# Altium integrated library HRR-Hardware.IntLib: 36 symbols
Pins are listed as number, name and electrical type; pins without a type are passive.

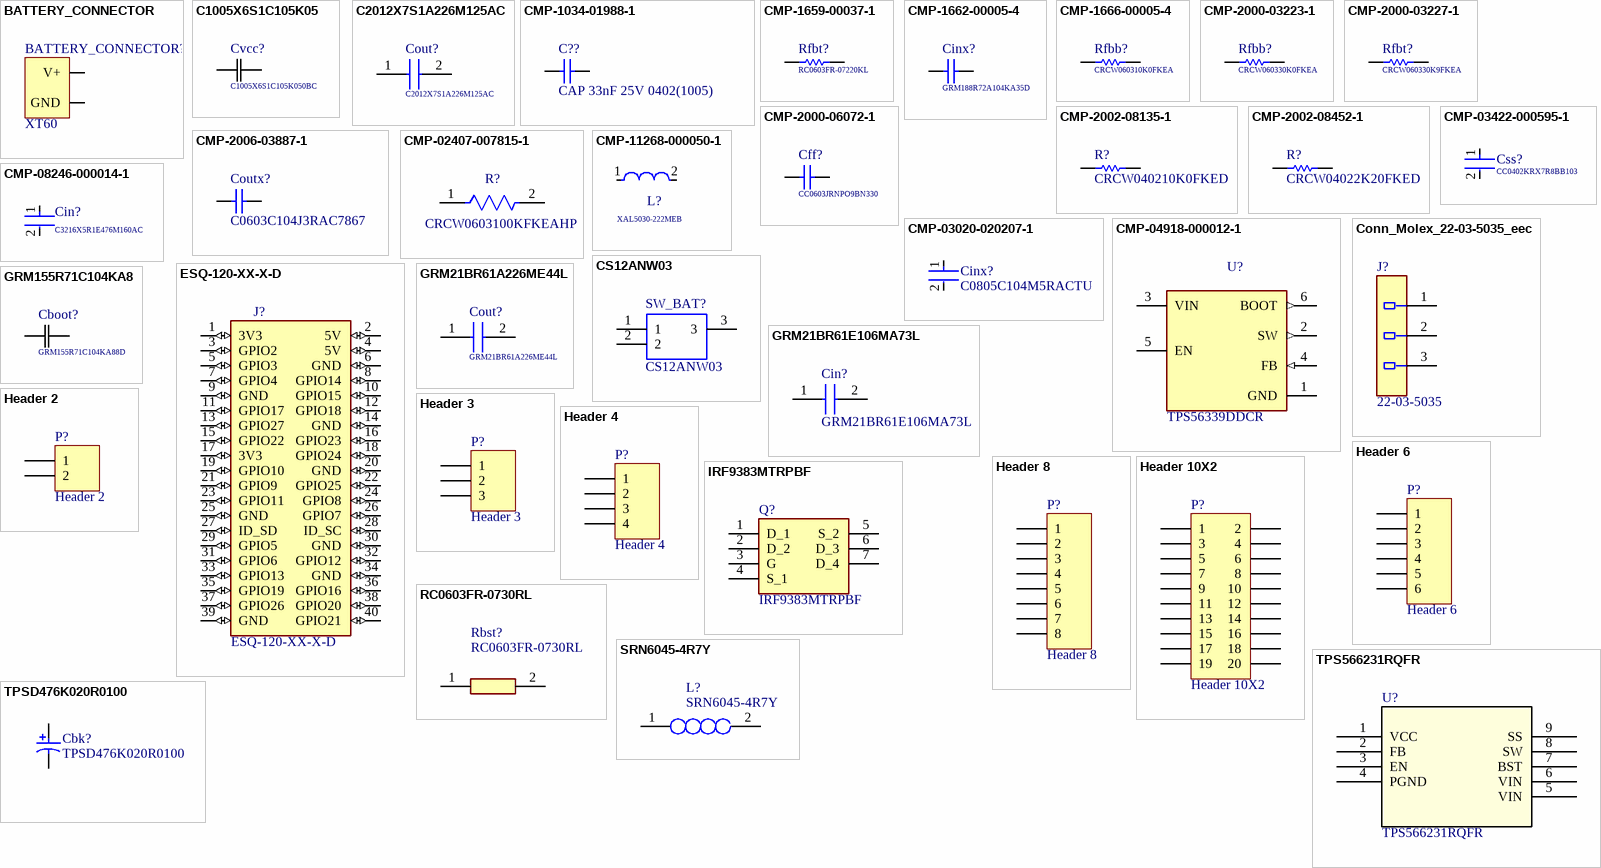
[diagram p0: symbols BATTERY_CONNECTOR to TPSD476K020R0100]

## BATTERY_CONNECTOR
designator BATTERY_CONNECTOR?, comment XT60
XT60 PRT-10474
footprint BATTERY_CONECTO-PCB
pins: 0 V+, 1 GND

## C1005X6S1C105K05
designator Cvcc?, comment C1005X6S1C105K050BC
No Description Available; Vendor: TDK; Built_By: EMA_UL_Team; SourceLibrary: TDK_2015_05_22; Manufacturer_Part_Number: C1005X6S1C105K050BC; Copyright: Copyright (C) 2018 Accelerated Designs. All rights reserved; RefDes: RefDes; Type: DEV
footprint CAP_1005_TDK
pins: 1, 2

## C2012X7S1A226M125AC
designator Cout?
Capacitor; Manufacturer_Name: TDK; Datasheet Link: https://componentsearchengine.com//C2012X7S1A226M125AC.pdf; Height: 1.45mm; Mouser2 Part Number: 810-C2012X7S1A226MAC; Mouser2 Price/Stock: https://www.mouser.com/Search/Refine.aspx?Keyword=810-C2012X7S1A226MAC; Manufacturer_Part_Number: C2012X7S1A226M125AC
footprint CAPC2012X145N
pins: 1, 2

## CMP-1034-01988-1
designator C??, comment CAP 33nF 25V 0402(1005)
CAP 33nF 25V ±10% 0402 (1005 Metric) Thickness 0.6mm SMD; Manufacturer: TDK; Manufacturer Part Number: C1005X5R1E333K; Manufacturer Part Number: C1005X7R1E333K; Manufacturer: Murata; Manufacturer Part Number: GRM155R71E333KA88D; Manufacturer: KEMET; Manufacturer Part Number: C0402C333K3RAC; Manufacturer Part Number: C0402C333K3RACTU; Tolerance: Â±10%; Case-EIA: 0402; Case-Metric: 1005; Rated Voltage: 25 V; Max Thickness: 0.6 mm; Value: 33nF; Technology: SMT
footprint CAPC0402(1005)60_N (Chip Capacitor, Body 1.0x0.5mm, Height 0.6mm, IPC Medium Density)
footprint CAPC0402(1005)60_M (Chip Capacitor, Body 1.0x0.5mm, Height 0.6mm, IPC Low Density)
footprint CAPC0402(1005)60_L (Chip Capacitor, Body 1.0x0.5mm, Height 0.6mm, IPC High Density)
pins: 1, 2
1 alternate drawing of the same symbol

## CMP-1659-00037-1
designator Rfbt?, comment RC0603FR-07220KL
Chip Resistor, 220 KOhm, +/- 1%, 100 mW, -55 to 155 degC, 0603 (1608 Metric), RoHS, Tape and Reel; Manufacturer: Yageo; Resistance: 0.1 Ohm; ComponentLink1Description: Manufacturer URL; ComponentLink2Description: Datasheet; ComponentLink1URL: http://www.yageo.com/; REACH SVHC: No SVHC; RoHSCompliant: true; DatasheetVersion: Rev. 4, 02/2016; Min Operating Temperature: -25 degC; Height: 0.25 inch; ComponentLink2URL: http://www.yageo.com/documents/recent/PYu-RC_Group_51_RoHS_L_04.pdf; PackageDescription: 2-Pin Surface Mount Device, Body 1.6 x 0.8 mm; Max Operating Temperature: 70 degC; Width: 0.25 inch; Length: 0.75 inch; PackageReference: 0603; Manufacturer Part Number: RC0603FR-07220KL
footprint RESC1608X55X25ML10T15 (Chip Resistor, 2-Leads, Body 1.70x0.90mm, IPC Low Density)
footprint RESC1608X55X25LL10T15 (Chip Resistor, 2-Leads, Body 1.70x0.90mm, IPC High Density)
footprint RESC1608X55X25NL10T15 (Chip Resistor, 2-Leads, Body 1.70x0.90mm, IPC Medium Density)
pins: 1, 2

## CMP-1662-00005-4
designator Cinx?, comment GRM188R72A104KA35D
Chip Capacitor, 0.1 uF, +/- 10%, 100 V, 0603 (1608 Metric), RoHS, Tape and Reel; Manufacturer: Murata; Voltage Rating: 100 V; Max Operating Temperature: 125 degC; Package Quantity: 4000; Packaging: Tape and Reel; Length: 1.6 mm; DatasheetVersion: 02/2016; ComponentLink2URL: http://search.murata.co.jp/Ceramy/image/img/A01X/G101/ENG/GRM188R72A104KA35-01.pdf; ComponentLink1Description: Manufacturer URL; Height: 0.8 mm; REACH SVHC: No SVHC; Mounting Technology: Surface Mount; Min Operating Temperature: -55 degC; ComponentLink2Description: Datasheet; PackageReference: 0603; ComponentLink1URL: http://www.murata.com/; RoHSCompliant: true; PackageDescription: 2-Pin Surface Mount Device, Body 1.6 x 0.8 mm; Mount: Surface Mount; Manufacturer Part Number: GRM188R72A104KA35D
footprint CAPC1608X90X35NL10T15 (Chip Capacitor, 2-Leads, Body 1.7x0.9mm, IPC Medium Density)
footprint CAPC1608X90X35LL10T15 (Chip Capacitor, 2-Leads, Body 1.7x0.9mm, IPC High Density)
footprint CAPC1608X90X35ML10T15 (Chip Capacitor, 2-Leads, Body 1.7x0.9mm, IPC Low Density)
pins: 1, 2

## CMP-1666-00005-4
designator Rfbb?, comment CRCW060310K0FKEA
Chip Resistor, 10 KOhm, +/- 1%, 100 mW, -55 to 155 degC, 0603 (1608 Metric), RoHS, Tape and Reel; Manufacturer: Vishay Semiconductor; Manufacturer: Vishay; Voltage Rating: 75 V; Max Operating Temperature: 155 degC; PackageDescription: 2-Pin Surface Mount Device, Body 1.575 x 0.85 mm; ComponentLink1Description: Manufacturer URL; RoHSCompliant: true; PackageReference: 0603; REACH SVHC: Unknown; Length: 1.55 mm; DatasheetVersion: 06/2012; Packaging: Tape and Reel; Min Operating Temperature: -55 degC; Mounting Technology: Surface Mount; ComponentLink2URL: https://datasheet.ciiva.com/11809/0900766b80d98afc-11809037.pdf; Height: 0.45 mm; ComponentLink2Description: Datasheet; Package Quantity: 5000; ComponentLink1URL: http://www.vishay.com/; Manufacturer Part Number: CRCW060310K0FKEA
footprint RESC1609X50X30NL8T20 (Chip Resistor, 2-Leads, Body 1.65x0.95mm, IPC Medium Density)
footprint RESC1609X50X30ML8T20 (Chip Resistor, 2-Leads, Body 1.65x0.95mm, IPC Low Density)
footprint RESC1609X50X30LL8T20 (Chip Resistor, 2-Leads, Body 1.65x0.95mm, IPC High Density)
pins: 1, 2

## CMP-2000-03223-1
designator Rfbb?, comment CRCW060330K0FKEA
Manufacturer: Vishay Dale; Manufacturer: Vishay; Part Number: CRCW060330K0FKEA; Manufacturer Part Number: CRCW060330K0FKEA
footprint RESC1609X50X30LL10T20 (Chip Resistor, 2-Leads, Body 1.55x0.85mm, IPC High Density)
footprint RESC1609X50X30ML10T20 (Chip Resistor, 2-Leads, Body 1.55x0.85mm, IPC Low Density)
footprint RESC1609X50X30NL10T20 (Chip Resistor, 2-Leads, Body 1.55x0.85mm, IPC Medium Density)
pins: 1, 2
1 alternate drawing of the same symbol

## CMP-2000-03227-1
designator Rfbt?, comment CRCW060330K9FKEA
Manufacturer: Vishay Dale; Manufacturer: Vishay; Part Number: CRCW060330K9FKEA; Manufacturer Part Number: CRCW060330K9FKEA
footprint RESC1609X50X30LL10T20 (Chip Resistor, 2-Leads, Body 1.55x0.85mm, IPC High Density)
footprint RESC1609X50X30NL10T20 (Chip Resistor, 2-Leads, Body 1.55x0.85mm, IPC Medium Density)
footprint RESC1609X50X30ML10T20 (Chip Resistor, 2-Leads, Body 1.55x0.85mm, IPC Low Density)
pins: 1, 2
1 alternate drawing of the same symbol

## CMP-2000-06072-1
designator Cff?, comment CC0603JRNPO9BN330
Chip Capacitor, 33 pF, +/- 5%, 50 V, -55 to 125 degC, 0603 (1608 Metric), RoHS, Tape and Reel; Manufacturer: Yageo; Product Training Modules: MultilayerCeramicCapacitors; Voltage - Rated: 50V; Capacitance: 33pF; Featured Product: CommodityMultilayerCeramicCapacitors–CCSeries; Other Names: 0603CG330J9B200223886715339223886715339311-1064-2311-1282-2311-1282-2-NDCC0603JRNP09BN330BCC0603JRNPO9BN330B; Online Catalog: CCSeries; Temperature Coefficient: C0G,NP0; Operating Temperature: -55°C~125°C; Thickness (Max): 0.035"(0.90mm); Size / Dimension: 0.063"Lx0.031"W(1.60mmx0.80mm); Lead Spacing: -; Mounting Type: SurfaceMount,MLCC; Tolerance: ±5%; Standard Package: 4,000; Mounting Technology: SurfaceMount; Ratings: -; Applications: GeneralPurpose; Height - Seated (Max): -; Packaging: Tape&Reel(TR); Series: CC; Package / Case: 0603(1608Metric); Package Description: 2-Pin Surface Mount Device, Body 1.6 x 0.8 mm; Manufacturer URL: http://www.yageo.com/; Family: CeramicCapacitors; Package Reference: 0603; Category: Capacitors; Datasheet Version: Rev. 14, 07/2016; Datasheet URL: http://www.yageo.com/NewPortal/yageodocoutput?fileName=/pdf/MLCC/UPY-GP_NP0_16V-to-50V_14.pdf; Features: -; Lead Style: -; Manufacturer Part Number: CC0603JRNPO9BN330
footprint CAPC1608X90X40LL10T20 (Chip Capacitor, 2-Leads, Body 1.70x0.90mm, IPC High Density)
footprint CAPC1608X90X40ML10T20 (Chip Capacitor, 2-Leads, Body 1.7x0.9mm, IPC Low Density)
footprint CAPC1608X90X40NL10T20 (Chip Capacitor, 2-Leads, Body 1.70x0.90mm, IPC Medium Density)
pins: 1, 2

## CMP-2002-08135-1
designator R?, comment CRCW040210K0FKED
Manufacturer: Vishay Dale; Manufacturer: Vishay; Manufacturer Part Number: CRCW0402-10K0FKED; Part Number: CRCW040210K0FKED
footprint RESC1005X40X25NL05T05 (Chip Resistor, 2-Leads, Body 1.00x0.50mm, IPC Medium Density)
footprint RESC1005X40X25LL05T05 (Chip Resistor, 2-Leads, Body 1.00x0.50mm, IPC High Density)
footprint RESC1005X40X25ML05T05 (Chip Resistor, 2-Leads, Body 1.00x0.50mm, IPC Low Density)
pins: 1, 2
1 alternate drawing of the same symbol

## CMP-2002-08452-1
designator R?, comment CRCW04022K20FKED
Manufacturer: Vishay Dale; Manufacturer: Vishay; Part Number: CRCW04022K20FKED; Manufacturer Part Number: CRCW04022K20FKED
footprint RESC1005X40X25NL05T05 (Chip Resistor, 2-Leads, Body 1.00x0.50mm, IPC Medium Density)
footprint RESC1005X40X25LL05T05 (Chip Resistor, 2-Leads, Body 1.00x0.50mm, IPC High Density)
footprint RESC1005X40X25ML05T05 (Chip Resistor, 2-Leads, Body 1.00x0.50mm, IPC Low Density)
pins: 1, 2
1 alternate drawing of the same symbol

## CMP-2006-03887-1
designator Coutx?, comment C0603C104J3RAC7867
Manufacturer: Kemet; Manufacturer Part Number: C0603C104J3RACTU; Part Number: C0603C104J3RAC7867; Manufacturer: KEMET
footprint CAPC1608X87X35NL15T15 (Chip Capacitor, 2-Leads, Body 1.60x0.80mm, IPC Medium Density)
footprint CAPC1608X87X35LL15T15 (Chip Capacitor, 2-Leads, Body 1.60x0.80mm, IPC High Density)
footprint CAPC1608X87X35ML15T15 (Chip Capacitor, 2-Leads, Body 1.60x0.80mm, IPC Low Density)
pins: 1, 2
1 alternate drawing of the same symbol

## CMP-02407-007815-1
designator R?, comment CRCW0603100KFKEAHP
RES Thick Film, 100kΩ, 1%, 0.33W, 100ppm/°C, 0603; Manufacturer: Vishay; Power Rating: 250mW; Voltage Rating: 75V; Resistance: 100kR; Min Operating Temperature: -55°C; Case/Package: 0603; Composition: Thick Film; Military Standard: Not; Temperature Coefficient: 100ppm/°C; Lead Free: Lead Free; Weight: 7.1E-05oz; Contact Plating: Tin; Width: 0.8mm; Length: 1.6mm; Radiation Hardening: No; Tolerance: 1%; Case Code (Metric): 1608; Features: Automotive AEC-Q200; Packaging: Tape and Reel; Max Power Dissipation: 250mW; Voltage Rating (DC): 75V; Height: 0.45mm; Case Code (Imperial): 0603; Number of Terminations: 2; Depth: 0.85mm; Max Operating Temperature: 155°C; Package Quantity: 10; Termination: SMD/SMT; Manufacturer Part Number: CRCW0603100KFKEAHP
footprint FP-CRCW0603-HPe3-IPC_C
footprint FP-CRCW0603-HPe3-MFG
footprint FP-CRCW0603-HPe3-IPC_A
footprint FP-CRCW0603-HPe3-IPC_B
pins: 1, 2

## CMP-03020-020207-1
designator Cinx?, comment C0805C104M5RACTU
CAP CER 0.1UF 50V X7R 0805; Manufacturer: KEMET; Tolerance: 0.2; Temperature Coefficient: 30ppm/°C; Capacitance: 0.10 μF; Value: 0.10 μF; Temperature: -55°C to +125°C; RoHS: TRUE; Temperature Range Low: -55°C; Device Class L3: Ceramic Capacitors; Manufacturer Part Number: C0805C104M5RACTU; Octopart: https://octopart.com/c0805c104m5ractu-kemet-129379; Ipc Land Pattern Name: CAPC200125X78; Mouser Description: Multilayer Ceramic Capacitors MLCC - SMD/SMT 50volts 0.1uF X7R 20%; Temperature Range High: +125°C; Material: Ceramic; Package: C0805C-DN; Temperature Characteristic: X7R; Automotive: No; ComponentLink2URL: https://content.kemet.com/datasheets/KEM_C1003_C0G_SMD.pdf; Device Class L1: Passive Components; ComponentLink2Description: Datasheet; Device Class L2: Capacitors; Voltage Rating: 50 V; Digikey Description: CAP CER 0.1UF 50V X7R 0805; Lead Free: Yes; Height: 0.88mm; Category: Cap
footprint FP-C0805C-DN-MFG
footprint FP-C0805C-DN-IPC_C
footprint FP-C0805C-DN-IPC_B
footprint FP-C0805C-DN-IPC_A
pins: 1, 2

## CMP-03422-000595-1
designator Css?, comment CC0402KRX7R8BB103
CAP CER 10000PF 25V X7R 0402; Manufacturer: YAGEO; Automotive Grade: NA; Value: 10 nF; Temperature Coefficient: 30ppm/°C; Tolerance: 0.1; Digikey Description: CAP CER 10000PF 25V X7R 0402; Temperature: -55°C to +125°C; Temperature Range Low: -55°C; Ipc Land Pattern Name: CAPC10050X50; ComponentLink2Description: Datasheet; Temperature Characteristic: X7R; Material: Ceramic; Category: Cap; Footprint Url: http://www.yageo.com/exep/pages/download/literatures/UPY-C_GEN_24.pdf; Manufacturer Part Number: CC0402KRX7R8BB103; ComponentLink2URL: http://www.yageo.com/documents/recent/UPY-GP_NP0_16V-to-50V_16.pdf; Device Class L2: Capacitors; Octopart: https://octopart.com/cc0402krx7r8bb103-yageo-8376512; RoHS: TRUE; Device Class L1: Passive Components; Voltage Rating: 25 V; Mouser Description: Multilayer Ceramic Capacitors MLCC - SMD/SMT 10nF 25V X7R 10%; Automotive: No; Package: CC0402; Lead Free: Yes; Device Class L3: Ceramic Capacitors; Height: 0.55mm; Temperature Range High: +125°C; Capacitance: 10 nF; Manufacturer: Yageo
footprint FP-CC0402-MFG
footprint FP-CC0402-IPC_C
footprint FP-CC0402-IPC_B
footprint FP-CC0402-IPC_A
pins: 1, 2

## CMP-04918-000012-1
designator U?, comment TPS56339DDCR
PWR MGMT SPECIALIZED REGULATOR; Manufacturer: Texas Instruments; Output Type: AdjustableProgrammable; Max Supply Voltage: 24V; Min Supply Voltage: 4.5V; Nominal Supply Current: 98uA; Max Duty Cycle: 97%; Number Of Outputs: 1; Output Current: 3A; Switching Topology: Buck; Standoff Height: 0mm; Switching Frequency: 500kHz; Output Voltage: 0.8-16V; Max Junction Temp: +125°C; ComponentLink2Description: Datasheet; ComponentLink2URL: http://www.ti.com/lit/ds/symlink/tps56339.pdf; Package: DDC0006A; RoHS: TRUE; Temperature: -40°C to +125°C; Temperature Range Low: -40°C; Device Class L3: Voltage Regulators - Switching; Temperature Range High: +125°C; Device Class L2: Power Management ICs; Device Class L1: Integrated Circuits (ICs); Category: IC; Manufacturer Part Number: TPS56339DDCR; Octopart: https://octopart.com/tps56339ddcr-texas+instruments-101466410; Automotive: No; Height: 1.1mm; Digikey Description: PWR MGMT SPECIALIZED REGULATOR; Lead Free: Yes; Mouser Description: 4.5-V to 24-V input, 3-A output synchronous buck converter 6-SOT-23-THIN -40 to 125
footprint FP-DDC0006A-MFG
footprint FP-DDC0006A-IPC_C
footprint FP-DDC0006A-IPC_B
footprint FP-DDC0006A-IPC_A
pins: 1 GND (power), 2 SW (out), 3 VIN, 4 FB (in), 5 EN, 6 BOOT (out)

## CMP-08246-000014-1
designator Cin?, comment C3216X5R1E476M160AC
CAP CER 47UF 25V X5R 1206; 3DS Part Number: 220-00004; Manufacturer: TDK; Temperature Coefficient: 15%; Tolerance: 20%; Height: 1.8mm; Device Class L1: Passive Components; Temperature Characteristic: X5R; Voltage: 25V; Digikey Description: CAP CER 47UF 25V X5R 1206; Voltage Rating: 25V; ComponentLink2URL: https://product.tdk.com/info/en/catalog/datasheets/mlcc_commercial_general_en.pdf; Category: Cap; Capacitance: 47uF; Ipc Land Pattern Name: CAPC320160X160; Temperature Range High: +85°C; ComponentLink2Description: Datasheet; Temperature: -55°C to +85°C; Mouser Description: Multilayer Ceramic Capacitors MLCC - SMD/SMT 1206 47uF 25volts X5R 20%; Lead Free: Yes; RoHS: TRUE; Device Class L2: Capacitors; Device Class L3: Ceramic Capacitors; Manufacturer Part Number: C3216X5R1E476M160AC; Automotive: No; Temperature Range Low: -55°C; Footprint Url: https://product.tdk.com/info/en/catalog/spec/mlccspec_commercial_general_midvoltage_en.pdf; Material: Ceramic; Value: 47uF; Octopart: https://octopart.com/c3216x5r1e476m160ac-tdk-25947783; Package: C3216-160
footprint FP-C3216-160-MFG
footprint FP-C3216-160-IPC_C
footprint FP-C3216-160-IPC_B
footprint FP-C3216-160-IPC_A
pins: 1, 2

## CMP-11268-000050-1
designator L?, comment XAL5030-222MEB
Fixed Inductors 2.2uH 20% 9.7A 14.5mOhms; Manufacturer: Coilcraft; DC Resistance (DCR): 14.5mR; Shielding: Shielded; Max DC Current: 9.2A; Test Frequency: 100kHz; Self Resonant Frequency: 38MHz; Core Material: Composite; Lead Free: Contains Lead; Inductance: 2.2uH; Max Operating Temperature: 125°C; Termination: SMD/SMT; Min Operating Temperature: -40°C; Height: 3.1mm; Package Quantity: 20; Packaging: Tape and Reel; Tolerance: 20%; Length: 5.68mm; Width: 5.48mm; Manufacturer Part Number: XAL5030-222MEB
footprint FP-XAL5030-222MEB-MFG
pins: 1, 2

## Conn_Molex_22-03-5035_eec
designator J?  Part Number: 22-03-5035  (hidden comment: Conn_Molex_22-03-5035_eec)
CONN 3 Positions Header Connector 0.098" (2.50mm) Through Hole Tin; Manufacturer: Molex; Num Pins: 3; Category E7012A0Bd22E3Cc6: Headers & Receptacles; pin_pitch: 2.5mm; shrouded: Yes; glow_wire_compliant: Non-Compliant; size_length: 9.9mm; contact_material: Brass; voltage_rating_ac: 250V; number_of_rows: 1; Category 75Fab8F04590Ae3D: Connectors and Adapters; contact_resistance: 20mΩ; size_width: 4.9mm; gender: Female; current_rating: 3A; size_height: 5.9mm; insulation_resistance: 1GΩ; Category 0836C53C3D42D3F1: Connectors; helpURL: https://upverter.com/upn/revision/5f4eec58f2a5589a/; ComponentLink2Description: Datasheet; Temperature: -40°C to +105°C; Package: CONN_PTH_HDR3; Supplier 2: Mouser; Price: 0.362417304973; Supplier 1: Digi-Key; ComponentLink1URL: https://upverter.com/upn/revision/5f4eec58f2a5589a/; Supplier Part Number 2: 538-22-03-5035; Supplier Part Number 1: WM18887-ND; ComponentLink1Description: Upverter; ComponentLink2URL: http://www.molex.com/pdm_docs/sd/022035035_sd.pdf; RoHS: TRUE; Mouser Part Number: 538-22-03-5035; orientation: Vertical; number_of_circuits: 3; lifecycle_status: Active; Temperature Range High: +105°C; number_of_contacts: 3; Temperature Range Low: -40°C; Digikey Part Number: WM18887-ND; contact_plating: Tin; voltage_rating_dc: 250V; Lead Free: yes; flammability_rating: UL 94 V-0; halogen_free_status: Not Low Halogen; Digikey Description: CONN 3 Positions Header Connector 0.098" (2.50mm) Through Hole Tin; number_of_positions: 3; Mounting Type: pcb; Octopart Part Number: 2021e92f3fb6ffe6
footprint Molex_22-03-5035_0
pins: 1, 2, 3

## CS12ANW03
designator SW_BAT?
NKK SWITCHES - CS12ANW03 - SWITCH, SLIDE, SPDT, 3A, 250V, TH; Allied_Number: 70228233; Manufacturer_Name: NKK Switches; Manufacturer_Part_Number: CS12ANW03; RS Part Number: 1251847; RS Price/Stock: http://uk.rs-online.com/web/p/products/1251847; Allied Price/Stock: https://www.alliedelec.com/nkk-switches-cs12anw03/70228233/; Arrow Part Number: CS12ANW03; Arrow Price/Stock: https://www.arrow.com/en/products/cs12anw03/nkk-switches; Datasheet Link: http://www.nkkswitches.com/pdf/cs.pdf
footprint CS12ANW03
pins: 1, 2, 3

## ESQ-120-XX-X-D
designator J?
ESQ Series .100 PC/104â„¢ Elevated Socket Strip; MP: ESQ-120-38-S-D; MF: Samtec; Digi-Key_Purchase_URL: https://www.digikey.com/product-detail/en/samtec-inc/ESQ-120-38-S-D/ESQ-120-38-S-D-ND/7098755?utm_source=snapeda&utm_medium=aggregator&utm_campaign=symbol; SnapEDA_Link: https://www.snapeda.com/parts/ESQ-120-38-S-D/Samtec%20Inc/view-part/786160/?ref=snap; Digi-Key_Part_Number: ESQ-120-38-S-D-ND; Value: *; Package: None
footprint ESQ-120-XX-X-D
pins: 1 3V3 (io), 2 5V (io), 3 GPIO2 (io), 4 5V (io), 5 GPIO3 (io), 6 GND (io), 7 GPIO4 (io), 8 GPIO14 (io), 9 GND (io), 10 GPIO15 (io), 11 GPIO17 (io), 12 GPIO18 (io), 13 GPIO27 (io), 14 GND (io), 15 GPIO22 (io), 16 GPIO23 (io), 17 3V3 (io), 18 GPIO24 (io), 19 GPIO10 (io), 20 GND (io), 21 GPIO9 (io), 22 GPIO25 (io), 23 GPIO11 (io), 24 GPIO8 (io), 25 GND (io), 26 GPIO7 (io), 27 ID_SD (io), 28 ID_SC (io), 29 GPIO5 (io), 30 GND (io), 31 GPIO6 (io), 32 GPIO12 (io), 33 GPIO13 (io), 34 GND (io), 35 GPIO19 (io), 36 GPIO16 (io), 37 GPIO26 (io), 38 GPIO20 (io), 39 GND (io), 40 GPIO21 (io)

## GRM21BR61A226ME44L
designator Cout?
Capacitor; Manufacturer_Name: Murata Electronics; Datasheet Link: http://www.murata.com/~/media/webrenewal/support/library/catalog/products/capacitor/mlcc/c02e.pdf; Height: 1.45mm; Manufacturer_Part_Number: GRM21BR61A226ME44L; Arrow Part Number: GRM21BR61A226ME44L; Arrow Price/Stock: https://www.arrow.com/en/products/grm21br61a226me44l/murata-manufacturing; Mouser Part Number: 81-GRM21BR61A226ME4L; Mouser Price/Stock: https://www.mouser.co.uk/ProductDetail/Murata-Electronics/GRM21BR61A226ME44L?qs=eeBpzGFlv%252B8tSfxib2AMhw%3D%3D
footprint CAPC2012X145N
pins: 1, 2

## GRM21BR61E106MA73L
designator Cin?
Capacitor; Manufacturer_Name: Murata Electronics; Datasheet Link: https://componentsearchengine.com//GRM21BR61E106MA73L.pdf; Height: 1.45mm; Mouser2 Part Number: 81-GRM21BR61E106MA3L; Mouser2 Price/Stock: https://www.mouser.com/Search/Refine.aspx?Keyword=81-GRM21BR61E106MA3L; Manufacturer_Part_Number: GRM21BR61E106MA73L
footprint CAPC2012X145N
pins: 1, 2

## GRM155R71C104KA8
designator Cboot?, comment GRM155R71C104KA88D
CAP CER .1UF 16V X7R 0402; Vendor: Murata; Capacitance: 0.1ÂµF; Tolerance: Unknown; Operating_Temperature: -55Â°C ~ 125Â°C; Mounting_Type: Surface Mount, MLCC; HEADER_SECTION: Passives; HEADER_GROUP: Capacitors; R-S_Number: 6242317; Value: Unknown; SourceLibrary: Murata_2014-12-31; DigiKeyPartNumber: 490-3261-1-ND; Manufacturer_Part_Number: GRM155R71C104KA88D; Quantity_Available: 0; DataSheet: http://search.murata.co.jp/Ceramy/image/img/PDF/ENG/GRM155R71C104KA88.pdf; Voltage_-_Rated: 16V; Package_/_Case: 0402 (1005 metric); Temperature_Coefficient: X7R; Packaging: Cut Tape (CT); Features: General Purpose; Lead_Spacing: -; Thickness: 0.50mm; Manufacturer_Name: Murata; Mounting: Surface Mount; Voltage: Unknown; Package/Case: 0402; Current_Rating: Unknown; Copyright: Copyright (C) 2015 Accelerated Designs. All rights reserved; RefDes: RefDes; Type: DEV
footprint CAP_GRM_155_MUR
pins: 1, 2

## Header 2
designator P?
Header, 2-Pin; LatestRevisionDate: 17-Jul-2002; LatestRevisionNote: Re-released for DXP Platform.; Publisher: Altium Limited
footprint HDR1X2 (Connector; Header; 2 Position)
signal-integrity model Connector
pins: 1, 2

## Header 3
designator P?
Header, 3-Pin; LatestRevisionDate: 17-Jul-2002; LatestRevisionNote: Re-released for DXP Platform.; Publisher: Altium Limited
footprint HDR1X3 (Connector; Header; 3 Position)
signal-integrity model Connector
pins: 1, 2, 3

## Header 4
designator P?
Header, 4-Pin; LatestRevisionDate: 17-Jul-2002; LatestRevisionNote: Re-released for DXP Platform.; Publisher: Altium Limited
footprint HDR1X4 (Connector; Header; 4 Position)
signal-integrity model Connector
pins: 1, 2, 3, 4

## Header 6
designator P?
Header, 6-Pin; LatestRevisionDate: 17-Jul-2002; LatestRevisionNote: Re-released for DXP Platform.; Publisher: Altium Limited
footprint HDR1X6 (Connector; Header; 6 Position)
signal-integrity model Connector
pins: 1, 2, 3, 4, 5, 6

## Header 8
designator P?
Header, 8-Pin; LatestRevisionDate: 17-Jul-2002; LatestRevisionNote: Re-released for DXP Platform.; Publisher: Altium Limited
footprint HDR1X8 (Connector; Header; 8 Position)
signal-integrity model Connector
pins: 1, 2, 3, 4, 5, 6, 7, 8

## Header 10X2
designator P?
Header, 10-Pin, Dual row; LatestRevisionDate: 17-Jul-2002; LatestRevisionNote: Re-released for DXP Platform.; Publisher: Altium Limited
footprint HDR2X10 (Connector; Header; 10x2 Position)
signal-integrity model Connector
pins: 1, 2, 3, 4, 5, 6, 7, 8, 9, 10, 11, 12, 13, 14, 15, 16, 17, 18, 19, 20

## IRF9383MTRPBF
designator Q?
MOSFET (P-Channel); Manufacturer_Name: Infineon; Datasheet Link: https://www.infineon.com/dgdl/irf9383mpbf.pdf?fileId=5546d462533600a40153561169a11dab; Height: 0.7mm; Manufacturer_Part_Number: IRF9383MTRPBF
footprint IRF9383MTRPBF (Footprint not found)
pins: 1 D_1, 2 D_2, 3 G, 4 S_1, 5 S_2, 6 D_3, 7 D_4

## RC0603FR-0730RL
designator Rbst?
Resistor; Manufacturer_Name: YAGEO (PHYCOMP); Datasheet Link: http://www.yageo.com/documents/recent/PYu-RC0603_51_RoHS_L_v5.pdf; Height: 0.55mm; Manufacturer_Part_Number: RC0603FR-0730RL
footprint RESC1608X55N
pins: 1, 2

## SRN6045-4R7Y
designator L?
Inductor; Manufacturer_Name: Bourns; Datasheet Link: https://www.bourns.com/data/global/pdfs/SRN6045.pdf; Manufacturer_Part_Number: SRN6045-4R7Y
footprint SRN6045_1
pins: 1, 2

## TPS566231RQFR
designator U?
No Description Available; Built_By: EMA_Matt; Vendor: Texas Instruments; SourceLibrary: TI_2020-07-16; Datasheet: https://www.ti.com.cn/cn/lit/ds/symlink/tps566238.pdf?ts=1594414902944&ref_url=https%253A%252F%252Fwww.google.com%252F; Copyright: Copyright (C) 2018 Accelerated Designs. All rights reserved; Manufacturer_Part_Number: TPS566231RQFR; RefDes: RefDes; Type: DEV
footprint QFN_231RQFR_TEX
pins: 1 VCC (power), 2 FB, 3 EN, 4 PGND, 5 VIN, 6 VIN, 7 BST, 8 SW, 9 SS

## TPSD476K020R0100
designator Cbk?
CAP TANT 47UF 20V 10% 2917; Manufacturer: Kyocera AVX; Dielectric Material: Tantalum; ESR (Equivalent Series Resistance): 100mR; Leakage Current: 9.4uA; Polarity: Polar; Dissipation Factor: 6%; Ripple Current: 490uA; Supplier 1: Arrow Electronics; Manufacturer Part Number: TPSD476K020R0100; RoHS: Yes; Category: Tantalum Capacitors; Stock 1: 2; Pricing 1: 1=1.88550, 10=1.55250, 25=1.53920, 50=1.52390, 100=1.08810, 1000=1.02300 (USD); Mount: Surface Mount; Case/Package: 2917; Weight: 0.023634oz; Case Code (Imperial): 2917; Case Code (Metric): 7343; Min Operating Temperature: -55°C; Max Operating Temperature: 125°C; Capacitance: 47uF; Tolerance: 10%; Termination: SMD/SMT; Voltage: 20V; Features: General Purpose; Packaging: Tape and Reel; Voltage Rating: 20V; Package Quantity: 1; Length: 7.3mm; Height: 2.9mm; Depth: 4.3mm; Height - Seated (Max): 0.122inch; Width: 4.3mm; Radiation Hardening: No; REACH SVHC: No SVHC; Lead Free: Lead Free; ComponentLink1URL: https://datasheet.ciiva.com/11794/0900766b80962b61-11794592.pdf?src-supplier=RSComponents; ComponentLink1Description: https://datasheet.ciiva.com/11794/0900766b80962b61-11794592.pdf?src-supplier=RSComponents; ComponentLink2URL: https://datasheet.ciiva.com/39121/1154520-39121511.pdf?src-supplier=Jameco; ComponentLink2Description: https://datasheet.ciiva.com/39121/1154520-39121511.pdf?src-supplier=Jameco; ComponentLink3URL: https://datasheet.ciiva.com/26787/tpsd476k020r0100-26787068.pdf?src-supplier=IIIC; ComponentLink3Description: https://datasheet.ciiva.com/26787/tpsd476k020r0100-26787068.pdf?src-supplier=IIIC; ComponentLink4URL: https://datasheet.ciiva.com/7713/1680477-7713477.pdf?src-supplier=Element14; ComponentLink4Description: https://datasheet.ciiva.com/7713/1680477-7713477.pdf?src-supplier=Element14; ComponentLink5URL: https://datasheet.ciiva.com/7713/1680477-7713478.pdf?src-supplier=Element14; ComponentLink5Description: https://datasheet.ciiva.com/7713/1680477-7713478.pdf?src-supplier=Element14; ComponentLink6URL: https://datasheet.ciiva.com/16632/tps-16632569.pdf?src-supplier=Avnet+Europe; ComponentLink6Description: https://datasheet.ciiva.com/16632/tps-16632569.pdf?src-supplier=Avnet+Europe; ComponentLink7URL: https://datasheet.ciiva.com/12910/tps-23028-12910555.pdf?src-supplier=Mouser; ComponentLink7Description: https://datasheet.ciiva.com/12910/tps-23028-12910555.pdf?src-supplier=Mouser; ComponentLink8URL: https://datasheet.ciiva.com/11232/tps-11232172.pdf?src-supplier=Avnet; ComponentLink8Description: https://datasheet.ciiva.com/11232/tps-11232172.pdf?src-supplier=Avnet; ComponentLink9URL: https://datasheet.ciiva.com/265/tps-265005.pdf?src-supplier=Digi-Key; ComponentLink9Description: https://datasheet.ciiva.com/265/tps-265005.pdf?src-supplier=Digi-Key; ComponentLink10URL: https://datasheet.ciiva.com/265/tps-265006.pdf?src-supplier=Digi-Key; ComponentLink10Description: https://datasheet.ciiva.com/265/tps-265006.pdf?src-supplier=Digi-Key; ComponentLink11URL: https://datasheet.ciiva.com/265/tps-265007.pdf?src-supplier=Digi-Key; ComponentLink11Description: https://datasheet.ciiva.com/265/tps-265007.pdf?src-supplier=Digi-Key
footprint TPSD476K020R0100 (Molded Capacitor, 2-Leads, Body 7.50x4.5mm)
pins: 1, 2